# Altium footprint library SMT.PcbLib: 151 footprints (part 6 of 10)
Each footprint in its own frame and in the unit in brackets; x right, y up, seen from the top. Pads: shape width x height; smd on the part's side, far side on the other; paste and mask are expansions set on the pad; w line width, h text height; cw(c..) or ccw(c..) is an arc to the next point about the centre after c.
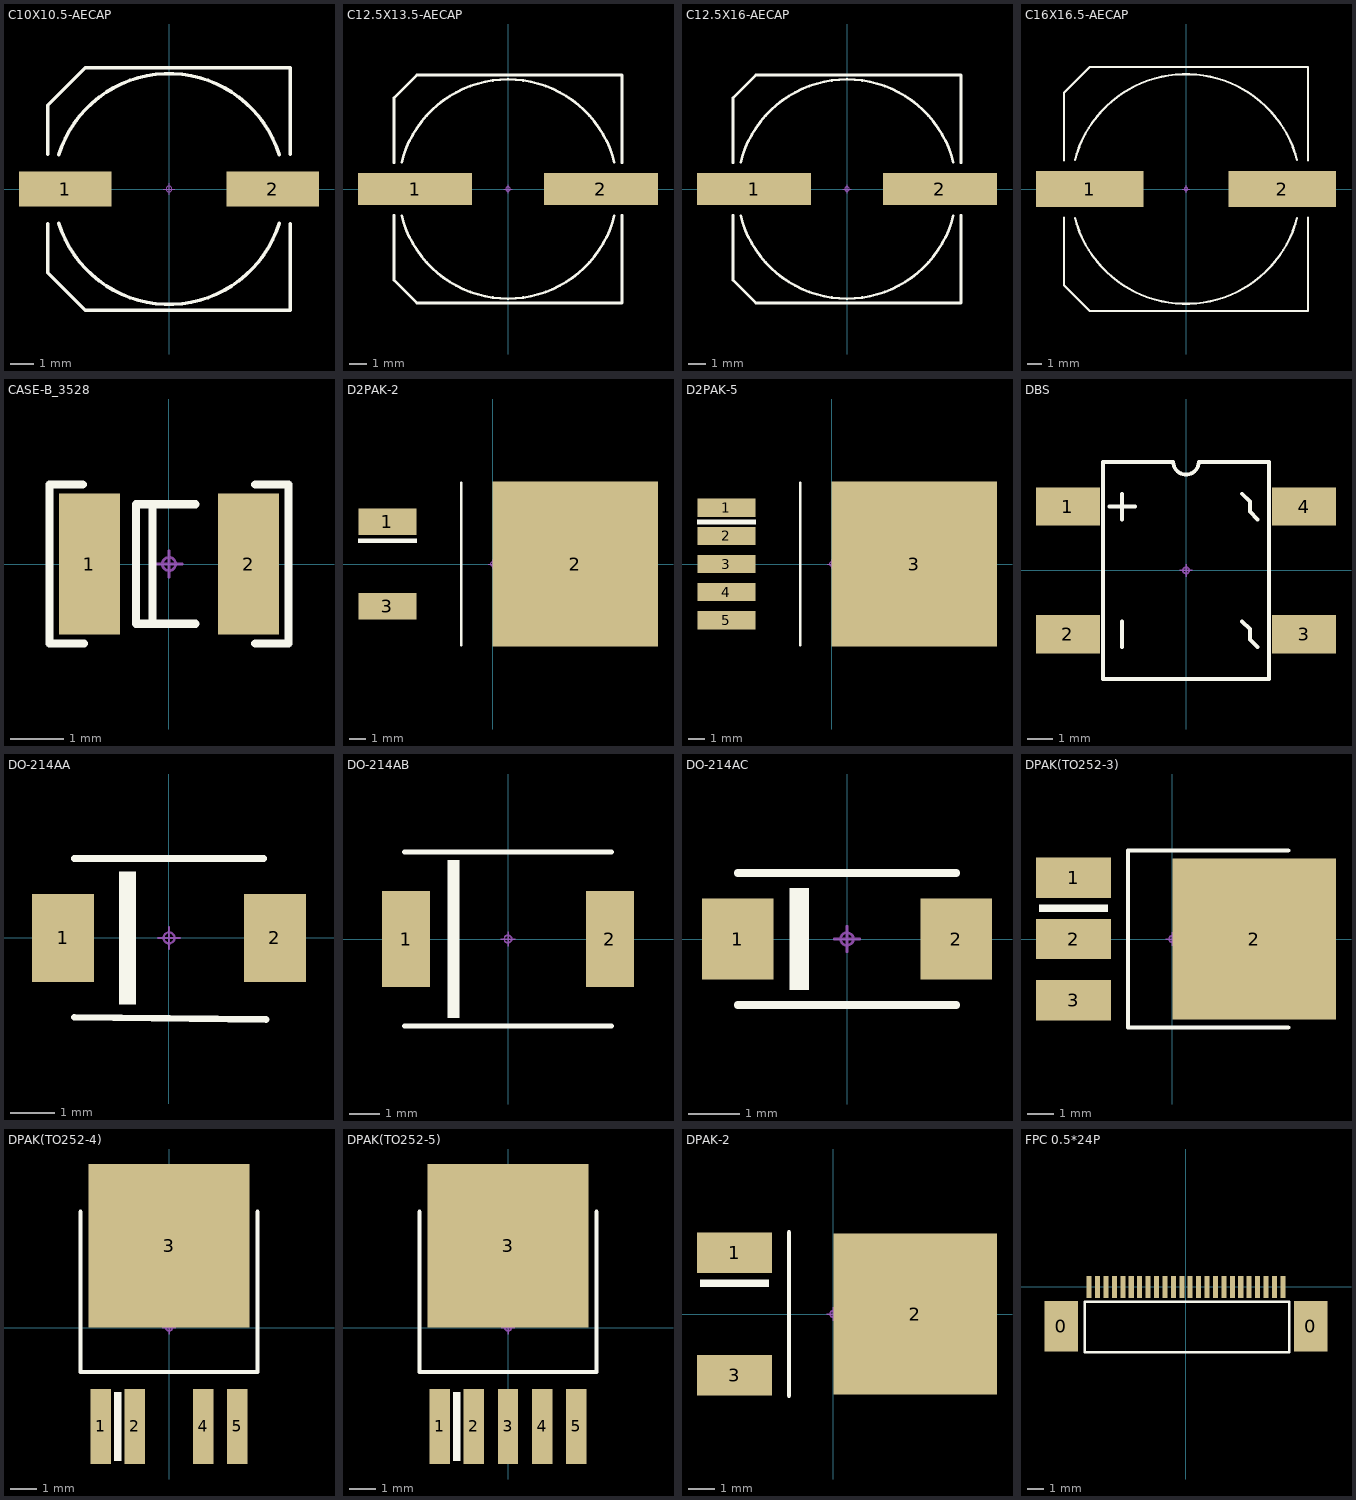
[diagram p5: the footprints below, top view; thin cyan lines are the x and y axes]

## C10X10.5-AECAP [mm]
pads (2):
  rect 4x1.5 smd: 1(-4.5,0) 2(4.5,0)
Top Overlay:
  lines w0.152: -5.25,-1.5 -5.25,-3.625 -3.625,-5.25 5.25,-5.25 5.25,-1.5 ; -5.25,1.5 -5.25,3.625 -3.625,5.25 5.25,5.25 5.25,1.5 ; -4.772,-1.491 ccw(c0,0) 4.772,-1.491 ; -4.772,1.491 cw(c0,0) 4.772,1.491
Mechanical 15:
  circle w0.05: c0,0 r0.125
  lines w0.05: -0.25,0 0.25,0 ; 0,-0.25 0,0.25
3D body "3d_10x10_3-aecap.stp": height 10.3, standoff 0, extent -6.05,-5.2 6.05,5.2

## C12.5X13.5-AECAP [mm]
pads (2):
  rect 6.5x1.8 smd: 1(-5.3,0) 2(5.3,0)
Top Overlay:
  lines w0.152: -6.5,-1.5 -6.5,-5.2 -5.2,-6.5 6.5,-6.5 6.5,-1.5 ; -6.5,1.5 -6.5,5.2 -5.2,6.5 6.5,6.5 6.5,1.5 ; -6.063,-1.516 ccw(c0,0) 6.063,-1.516 ; -6.063,1.516 cw(c0,0) 6.063,1.516
Mechanical 15:
  circle w0.05: c0,0 r0.125
  lines w0.05: -0.25,0 0.25,0 ; 0,-0.25 0,0.25
3D body "3d_12_5x16-aecap.stp": height 16.01, standoff 0, extent -8,-6.5 8,6.5

## C12.5X16-AECAP [mm]
pads (2):
  rect 6.5x1.8 smd: 1(-5.3,0) 2(5.3,0)
Top Overlay:
  lines w0.152: -6.5,-1.5 -6.5,-5.2 -5.2,-6.5 6.5,-6.5 6.5,-1.5 ; -6.5,1.5 -6.5,5.2 -5.2,6.5 6.5,6.5 6.5,1.5 ; -6.063,-1.516 ccw(c0,0) 6.063,-1.516 ; -6.063,1.516 cw(c0,0) 6.063,1.516
Mechanical 15:
  circle w0.05: c0,0 r0.125
  lines w0.05: -0.25,0 0.25,0 ; 0,-0.25 0,0.25
3D body "3d_12_5x16-aecap.stp": height 16.01, standoff 0, extent -8,-6.5 8,6.5

## C16X16.5-AECAP [mm]
height 3.8
pads (2):
  rect 7.5x2.5 smd: 1(-6.7,0) 2(6.7,0)
Top Overlay:
  lines w0.152: -8.5,-2 -8.5,-6.7 -6.7,-8.5 8.5,-8.5 8.5,-2 ; -8.5,2 -8.5,6.7 -6.7,8.5 8.5,8.5 8.5,2 ; -7.743,-2.011 ccw(c0,0) 7.743,-2.011 ; -7.743,2.011 cw(c0,0) 7.743,2.011
Mechanical 15:
  circle w0.05: c0,0 r0.125
  lines w0.05: -0.25,0 0.25,0 ; 0,-0.25 0,0.25
3D body "3d_16x16_5-aecap.stp": height 16.51, standoff 0, extent -10,-8.5 10,8.5

## CASE-B_3528 [mm]
pads (2):
  rect 1.15x2.65 smd paste-0.05: 1(-1.5,0) 2(1.5,0)
Top Overlay:
  lines w0.152: -1.625,1.5 -2.25,1.5 -2.25,-1.5 -1.6,-1.5 ; -0.31,-1.125 -0.31,1.121 ; 0.5,-1.125 -0.625,-1.125 -0.625,1.125 0.5,1.125 ; 1.625,-1.5 2.25,-1.5 2.25,1.5 1.625,1.5
Mechanical 15:
  circle w0.05: c0,0 r0.125
  lines w0.05: -0.25,0 0.25,0 ; 0,-0.25 0,0.25
3D body "1210_smt-taj-b.stp": height 1.9, standoff 0, extent -1.75,-1.4 1.75,1.4

## D2PAK-2 [mm]
height 4.5
pads (3):
  rect 3.5x1.6 smd paste-0.1: 1(-6.35,2.54) 3(-6.35,-2.54)
  rect 10x10 smd paste-5: 2(5,0)
Top Overlay:
  region: -8.128,1.27 -4.572,1.27 -4.572,1.524 -8.128,1.524
  lines w0.152: -1.9,-4.9 -1.9,4.9
Top Paste:
  rectangle: 8.4,3.6 9.9,4.6
  rectangle: 8.4,2 9.9,3
  rectangle: 8.4,0.5 9.9,1.5
  rectangle: 8.4,-1.5 9.9,-0.5
  rectangle: 8.4,-3 9.9,-2
  rectangle: 8.4,-4.5 9.9,-3.5
  rectangle: 6.4,-4.5 7.9,-3.5
  rectangle: 6.4,-3 7.9,-2
  rectangle: 6.4,-1.5 7.9,-0.5
  rectangle: 6.4,0.5 7.9,1.5
  rectangle: 6.4,2 7.9,3
  rectangle: 6.4,3.6 7.9,4.6
  rectangle: 4.4,3.6 5.9,4.6
  rectangle: 4.4,2 5.9,3
  rectangle: 4.4,0.5 5.9,1.5
  rectangle: 4.4,-1.5 5.9,-0.5
  rectangle: 4.4,-3 5.9,-2
  rectangle: 4.4,-4.5 5.9,-3.5
  rectangle: 2.4,-4.5 3.9,-3.5
  rectangle: 2.4,-3 3.9,-2
  rectangle: 2.4,-1.5 3.9,-0.5
  rectangle: 2.4,0.5 3.9,1.5
  rectangle: 2.4,2 3.9,3
  rectangle: 2.4,3.6 3.9,4.6
  rectangle: 0.4,3.6 1.9,4.6
  rectangle: 0.4,2 1.9,3
  rectangle: 0.4,-1.5 1.9,-0.5
  rectangle: 0.4,-3 1.9,-2
  rectangle: 0.4,-4.5 1.9,-3.5
  rectangle: 0.4,0.5 1.9,1.5
Mechanical 15:
  circle w0.05: c0,0 r0.125
  lines w0.05: -0.25,0 0.25,0 ; 0,-0.25 0,0.25
3D body "SW3dPS-TO263-3.STEP": height 4.88, standoff 0.08, extent -6.819,-5.055 8.851,4.945

## D2PAK-5 [mm]
height 4.5
pads (6):
  rect 3.5x1.1 smd: 1(-6.35,3.4) 2(-6.35,1.7) 3(-6.35,0) 4(-6.35,-1.7) 5(-6.35,-3.4)
  rect 10x10 smd paste-5: 3(5,0)
Top Overlay:
  region: -8.128,2.39 -4.572,2.39 -4.572,2.667 -8.128,2.667
  lines w0.152: -1.9,-4.9 -1.9,4.9
Top Paste:
  rectangle: 8.4,3.6 9.9,4.6
  rectangle: 8.4,2 9.9,3
  rectangle: 8.4,0.5 9.9,1.5
  rectangle: 8.4,-1.5 9.9,-0.5
  rectangle: 8.4,-3 9.9,-2
  rectangle: 8.4,-4.5 9.9,-3.5
  rectangle: 6.4,-4.5 7.9,-3.5
  rectangle: 6.4,-3 7.9,-2
  rectangle: 6.4,-1.5 7.9,-0.5
  rectangle: 6.4,0.5 7.9,1.5
  rectangle: 6.4,2 7.9,3
  rectangle: 6.4,3.6 7.9,4.6
  rectangle: 4.4,3.6 5.9,4.6
  rectangle: 4.4,2 5.9,3
  rectangle: 4.4,0.5 5.9,1.5
  rectangle: 4.4,-1.5 5.9,-0.5
  rectangle: 4.4,-3 5.9,-2
  rectangle: 4.4,-4.5 5.9,-3.5
  rectangle: 2.4,-4.5 3.9,-3.5
  rectangle: 2.4,-3 3.9,-2
  rectangle: 2.4,-1.5 3.9,-0.5
  rectangle: 2.4,0.5 3.9,1.5
  rectangle: 2.4,2 3.9,3
  rectangle: 2.4,3.6 3.9,4.6
  rectangle: 0.4,3.6 1.9,4.6
  rectangle: 0.4,2 1.9,3
  rectangle: 0.4,-1.5 1.9,-0.5
  rectangle: 0.4,-3 1.9,-2
  rectangle: 0.4,-4.5 1.9,-3.5
  rectangle: 0.4,0.5 1.9,1.5
Mechanical 15:
  circle w0.05: c0,0 r0.125
  lines w0.05: -0.25,0 0.25,0 ; 0,-0.25 0,0.25
3D body "to-263-5.stp": height 4.65, standoff -0.01, extent -6.698,-5.205 5.715,5.205

## DBS [mm]
pads (4):
  rect 2.5x1.5 smd: 1(-4.625,2.5) 2(-4.625,-2.5) 3(4.625,-2.5) 4(4.625,2.5)
Top Overlay:
  lines w0.152: -3,2.5 -2,2.5 ; -2.5,-3 -2.5,-2 ; -2.5,2 -2.5,3 ; 2.2,-2 2.5,-2.3 2.5,-2.7 2.8,-3 ; 2.2,3 2.5,2.7 2.5,2.3 2.8,2 ; -3.25,-4.25 3.25,-4.25 3.25,4.25 0.5,4.25 cw(c0,4.25) -0.5,4.25 -3.25,4.25 -3.25,-4.25
Mechanical 15:
  circle w0.05: c0,0 r0.125
  lines w0.05: -0.25,0 0.25,0 ; 0,-0.25 0,0.25
3D body "User Library-DFS.STEP": height 2.61, standoff 0.02, extent -5.15,-4.1 5.15,4.1

## DO-214AA [mm]
pads (2):
  rect 1.4x2 smd paste-0.1: 1(-2.4,0) 2(2.4,0)
Top Overlay:
  region: -1.125,1.5 -0.75,1.5 -0.75,-1.5 -1.125,-1.5
  lines w0.152: -2.15,-1.8 2.2,-1.85 ; -2.15,1.8 2.15,1.8
Mechanical 15:
  circle w0.05: c0,0 r0.125
  lines w0.05: -0.25,0 0.25,0 ; 0,-0.25 0,0.25
3D body "SMB_nominal.stp": height 2.32, standoff 0.02, extent -2.7,-1.8 2.7,1.8

## DO-214AB [mm]
pads (2):
  rect 1.6x3.2 smd paste-0.1: 1(-3.4,0) 2(3.4,0)
Top Overlay:
  region: -2,2.625 -1.625,2.625 -1.625,-2.625 -2,-2.625
  lines w0.152: -3.45,-2.9 3.45,-2.9 ; -3.45,2.9 3.45,2.9
Mechanical 15:
  circle w0.05: c0,0 r0.125
  lines w0.05: -0.25,0 0.25,0 ; 0,-0.25 0,0.25
3D body "smc_do-214ab.stp": height 2, standoff 0, extent -3.557,-2.795 3.557,2.795

## DO-214AC [mm]
pads (2):
  rect 1.4x1.6 smd paste-0.1: 1(-2.15,0) 2(2.15,0)
Top Overlay:
  region: -1.125,1 -0.75,1 -0.75,-1 -1.125,-1
  lines w0.152: -2.15,-1.3 2.15,-1.3 ; -2.15,1.3 2.15,1.3
Mechanical 15:
  circle w0.05: c0,0 r0.125
  lines w0.05: -0.25,0 0.25,0 ; 0,-0.25 0,0.25
3D body "do214ac.stp": height 1.9, standoff 0.03, extent -2.485,-1.2 2.485,1.2

## DPAK(TO252-3) [mm]
height 2.39
pads (4):
  rect 2.8x1.5 smd paste-0.1: 1(-3.683,2.286) 2(-3.683,0) 3(-3.683,-2.286)
  rect 6.1x6 smd paste-3.1: 2(3.048,0)
Top Overlay:
  region: -4.953,1.016 -2.413,1.016 -2.413,1.27 -4.953,1.27
  lines w0.152: 4.318,-3.302 -1.651,-3.302 -1.651,3.302 4.318,3.302
Top Paste:
  rectangle: 4,-2.8 5.2,-1.8
  rectangle: 4,-1.3 5.3,-0.3
  rectangle: 4,0.3 5.3,1.3
  rectangle: 4,1.9 5.3,2.9
  rectangle: 2.2,1.9 3.5,2.9
  rectangle: 2.2,0.3 3.5,1.3
  rectangle: 2.2,-1.3 3.5,-0.3
  rectangle: 2.2,-2.8 3.4,-1.8
  rectangle: 0.5,-2.8 1.8,-1.8
  rectangle: 0.5,-1.316 1.8,-0.3
  rectangle: 0.5,1.9 1.8,2.9
  rectangle: 0.5,0.3 1.8,1.3
Mechanical 15:
  circle w0.05: c0,0 r0.125
  lines w0.05: -0.25,0 0.25,0 ; 0,-0.25 0,0.25
3D body "sto252-3_.stp": height 1.2, standoff -0.01, extent -4.107,-3.25 5.393,3.25

## DPAK(TO252-4) [mm]
pads (5):
  rect 0.76x2.8 smd: 1(-2.54,-3.683) 2(-1.27,-3.683) 4(1.27,-3.683) 5(2.54,-3.683)
  rect 6x6.1 smd paste-3.1: 3(0,3.048)
Top Overlay:
  region: -1.778,-4.953 -1.778,-2.413 -2.032,-2.413 -2.032,-4.953
  lines w0.152: -3.302,4.318 -3.302,-1.651 3.302,-1.651 3.302,4.318
Top Paste:
  region: 2.8,4 2.8,5.2 1.8,5.2 1.8,4
  region: 1.3,4 1.3,5.3 0.3,5.3 0.3,4
  region: -0.3,4 -0.3,5.3 -1.3,5.3 -1.3,4
  region: -1.9,4 -1.9,5.3 -2.9,5.3 -2.9,4
  region: -1.9,2.2 -1.9,3.5 -2.9,3.5 -2.9,2.2
  region: -0.3,2.2 -0.3,3.5 -1.3,3.5 -1.3,2.2
  region: 1.3,2.2 1.3,3.5 0.3,3.5 0.3,2.2
  region: 2.8,2.2 2.8,3.4 1.8,3.4 1.8,2.2
  region: 2.8,0.5 2.8,1.8 1.8,1.8 1.8,0.5
  region: 1.316,0.5 1.316,1.8 0.3,1.8 0.3,0.5
  region: -1.9,0.5 -1.9,1.8 -2.9,1.8 -2.9,0.5
  region: -0.3,0.5 -0.3,1.8 -1.3,1.8 -1.3,0.5
Mechanical 15:
  circle w0.05: c0,0 r0.125
  lines w0.05: -0.25,0 0.25,0 ; 0,-0.25 0,0.25
3D body "sto252-5.stp": height 2.3, standoff -0.01, extent -3.25,-4.107 3.25,5.393

## DPAK(TO252-5) [mm]
pads (6):
  rect 0.76x2.8 smd: 1(-2.54,-3.683) 2(-1.27,-3.683) 3(0,-3.683) 4(1.27,-3.683) 5(2.54,-3.683)
  rect 6x6.1 smd paste-3.1: 3(0,3.048)
Top Overlay:
  region: -1.778,-4.953 -1.778,-2.413 -2.032,-2.413 -2.032,-4.953
  lines w0.152: -3.302,4.318 -3.302,-1.651 3.302,-1.651 3.302,4.318
Top Paste:
  region: 2.8,4 2.8,5.2 1.8,5.2 1.8,4
  region: 1.3,4 1.3,5.3 0.3,5.3 0.3,4
  region: -0.3,4 -0.3,5.3 -1.3,5.3 -1.3,4
  region: -1.9,4 -1.9,5.3 -2.9,5.3 -2.9,4
  region: -1.9,2.2 -1.9,3.5 -2.9,3.5 -2.9,2.2
  region: -0.3,2.2 -0.3,3.5 -1.3,3.5 -1.3,2.2
  region: 1.3,2.2 1.3,3.5 0.3,3.5 0.3,2.2
  region: 2.8,2.2 2.8,3.4 1.8,3.4 1.8,2.2
  region: 2.8,0.5 2.8,1.8 1.8,1.8 1.8,0.5
  region: 1.316,0.5 1.316,1.8 0.3,1.8 0.3,0.5
  region: -1.9,0.5 -1.9,1.8 -2.9,1.8 -2.9,0.5
  region: -0.3,0.5 -0.3,1.8 -1.3,1.8 -1.3,0.5
Mechanical 15:
  circle w0.05: c0,0 r0.125
  lines w0.05: -0.25,0 0.25,0 ; 0,-0.25 0,0.25
3D body "sto252S-5_.stp": height 1.2, standoff 0, extent -3.25,-4.115 3.25,5.393

## DPAK-2 [mm]
height 2.39
pads (3):
  rect 2.8x1.5 smd paste-0.1: 1(-3.683,2.286) 3(-3.683,-2.286)
  rect 6.1x6 smd paste-3.1: 2(3.048,0)
Top Overlay:
  region: -4.953,1.016 -2.413,1.016 -2.413,1.27 -4.953,1.27
  lines w0.152: -1.651,-3.048 -1.651,3.048
Top Paste:
  rectangle: 0.5,0.3 1.8,1.3
  rectangle: 0.5,1.9 1.8,2.9
  rectangle: 0.5,-1.316 1.8,-0.3
  rectangle: 0.5,-2.8 1.8,-1.8
  rectangle: 2.2,-2.8 3.4,-1.8
  rectangle: 2.2,-1.3 3.5,-0.3
  rectangle: 2.2,0.3 3.5,1.3
  rectangle: 2.2,1.9 3.5,2.9
  rectangle: 4,1.9 5.3,2.9
  rectangle: 4,0.3 5.3,1.3
  rectangle: 4,-1.3 5.3,-0.3
  rectangle: 4,-2.8 5.2,-1.8
Mechanical 15:
  circle w0.05: c0,0 r0.125
  lines w0.05: -0.25,0 0.25,0 ; 0,-0.25 0,0.25
3D body "td03b.stp": height 2.48, standoff 0.01, extent -4.122,-3.29 5.577,3.29

## FPC 0.5*24P [mm]
pads (26):
  rect 2x3 smd: 0(-7.4,-2.35) 0(7.4,-2.35)
  rect 0.3x1.3 smd: 1(-5.75,0) 2(-5.25,0) 3(-4.75,0) 4(-4.25,0) 5(-3.75,0) 6(-3.25,0) 7(-2.75,0) 8(-2.25,0) 9(-1.75,0) 10(-1.25,0) 11(-0.75,0) 12(-0.25,0) 13(0.25,0) 14(0.75,0) 15(1.25,0) 16(1.75,0) 17(2.25,0) 18(2.75,0) 19(3.25,0) 20(3.75,0) 21(4.25,0) 22(4.75,0) 23(5.25,0) 24(5.75,0)
Top Overlay:
  lines w0.152: -6,-3.875 -6,-0.875 6.125,-0.875 6.125,-3.875 -6,-3.875